# Altium schematic symbol library 13-Analog D 数模模数.SchLib: 573 symbols (part 4 of 6) (continued)
## MAX1162 (continued)
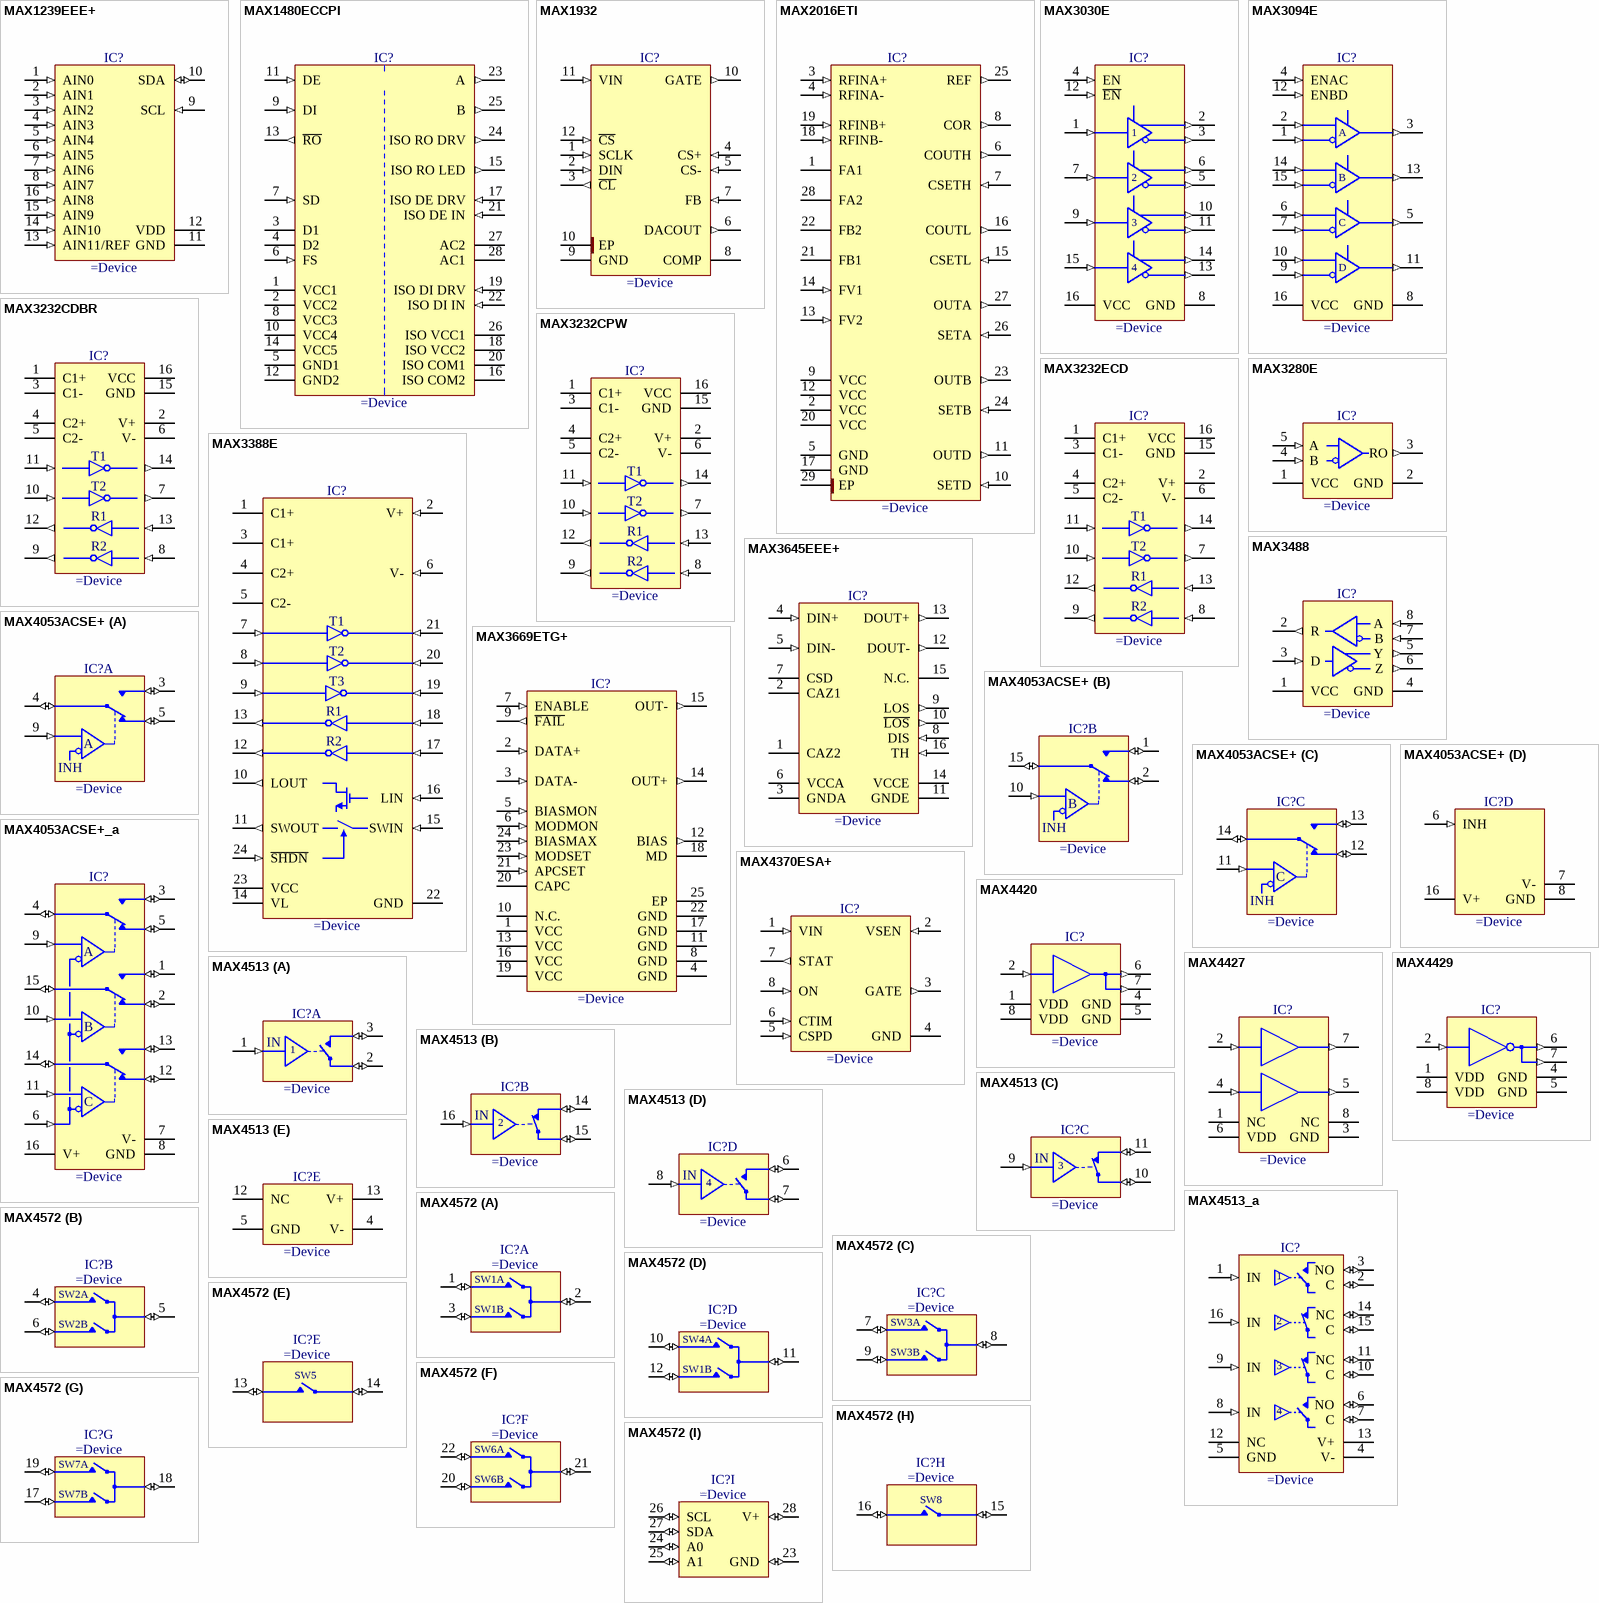
[diagram p26: symbols MAX1239EEE+ to MAX4572]

## MAX1239EEE+
designator IC?
2.7V to 3.6V, Low-Power, 12 Input Channels, 2-Wire Serial, 12-Bit ADC
pins: 1 AIN0 (in), 2 AIN1 (in), 3 AIN2 (in), 4 AIN3 (in), 5 AIN4 (in), 6 AIN5 (in), 7 AIN6 (in), 8 AIN7 (in), 9 SCL (in), 10 SDA (io), 11 GND (power), 12 VDD (power), 13 AIN11/REF (in), 14 AIN10 (in), 15 AIN9 (in), 16 AIN8 (in)

## MAX1480ECCPI
designator IC?
±15kV ESD-Protected, Isolated RS-485/RS-422 Data Interface
pins: 1 VCC1 (power), 2 VCC2 (power), 3 D1, 4 D2, 5 GND1 (power), 6 FS (in), 7 SD (in), 8 VCC3 (power), 9 DI (in), 10 VCC4 (power), 11 DE (in), 12 GND2 (power), 13 ~{RO} (out), 14 VCC5 (power), 15 ISO RO LED (out), 16 ISO COM2 (power), 17 ISO DE DRV (in), 18 ISO VCC2 (power), 19 ISO DI DRV (in), 20 ISO COM1 (power), 21 ISO DE IN (in), 22 ISO DI IN (in), 23 A (out), 24 ISO RO DRV (out), 25 B (out), 26 ISO VCC1 (power), 27 AC2, 28 AC1

## MAX1932
designator IC?
Digitally Controlled, 0.5% Accurate, Safest APD Bias Supply
pins: 1 SCLK (in), 2 DIN (in), 3 ~{CL} (out), 4 CS+ (in), 5 CS- (in), 6 DACOUT (out), 7 FB (in), 8 COMP, 9 GND (power), 10 GATE (out), 10 EP (power), 11 VIN (in), 12 ~{CS} (in)

## MAX2016ETI
designator IC?
LF-to-2.5GHz Dual Logarithmic Detector/Controller for Power, Gain, and VSWR Measurements
pins: 1 FA1, 2 VCC (power), 3 RFINA+ (in), 4 RFINA- (in), 5 GND (power), 6 COUTH (out), 7 CSETH (in), 8 COR (out), 9 VCC (power), 10 SETD (in), 11 OUTD (out), 12 VCC (power), 13 FV2 (in), 14 FV1 (in), 15 CSETL (in), 16 COUTL (out), 17 GND (power), 18 RFINB- (in), 19 RFINB+ (in), 20 VCC (power), 21 FB1, 22 FB2, 23 OUTB (out), 24 SETB (in), 25 REF (out), 26 SETA (in), 27 OUTA (out), 28 FA2, 29 EP (power)

## MAX3030E
designator IC?
±15kV ESD-Protected, 3.3V Quad RS-422 Transmitter
pins: 1 DI1 (in), 2 DO1+ (out), 3 DO1- (out), 4 EN (in), 5 DO2- (out), 6 DO2+ (out), 7 DI2 (in), 8 GND (power), 9 DI3 (in), 10 DO3+ (out), 11 DO3- (out), 12 ~{EN} (in), 13 DO4- (out), 14 DO4+ (out), 15 DI4 (in), 16 VCC (power)

## MAX3094E
designator IC?
±15kV ESD-Protected, 10Mbps, 3V, Low-Power Quad RS-422/RS-485 Receivers
pins: 1 A- (in), 2 A+ (in), 3 YA (out), 4 ENAC (in), 5 YC (out), 6 C+ (in), 7 C- (in), 8 GND (power), 9 D- (in), 10 D+ (in), 11 YD (out), 12 ENBD (in), 13 YB (out), 14 B+ (in), 15 B- (in), 16 VCC (power)
text: A; B; C; D

## MAX3232CDBR
designator IC?
3-V To 5.5-V Multichannel RS-232 Line Driver/Receiver With ±15kV IEC ESD Protection
pins: 1 C1+, 2 V+ (power), 3 C1-, 4 C2+, 5 C2-, 6 V- (power), 7 T2OUT (out), 8 R2IN (in), 9 R2OUT (out), 10 T2IN (in), 11 T1IN (in), 12 R1OUT (out), 13 R1IN (in), 14 T1OUT (out), 15 GND (power), 16 VCC (power)
text: T1; T2; R1; R2

## MAX3232CPW
designator IC?
3-V To 5.5-V Multichannel RS-232 Line Driver/Receiver With ±15kV IEC ESD Protection
pins: 1 C1+, 2 V+ (power), 3 C1-, 4 C2+, 5 C2-, 6 V- (power), 7 T2OUT (out), 8 R2IN (in), 9 R2OUT (out), 10 T2IN (in), 11 T1IN (in), 12 R1OUT (out), 13 R1IN (in), 14 T1OUT (out), 15 GND (power), 16 VCC (power)
text: T1; T2; R1; R2

## MAX3232ECD
designator IC?
3-V To 5.5-V Multichannel RS-232 Line Driver/Receiver With ±15kV IEC ESD Protection
pins: 1 C1+, 2 V+ (power), 3 C1-, 4 C2+, 5 C2-, 6 V- (power), 7 T2OUT (out), 8 R2IN (in), 9 R2OUT (out), 10 T2IN (in), 11 T1IN (in), 12 R1OUT (out), 13 R1IN (in), 14 T1OUT (out), 15 GND (power), 16 VCC (power)
text: T1; T2; R1; R2

## MAX3280E
designator IC?
±15kV ESD-Protected 52Mbps, 3V to 5.5V, RS-485/RS-422 True Fail-Safe Receiver
pins: 1 VCC (power), 2 GND (power), 3 RO (out), 4 B (in), 5 A (in)

## MAX3388E
designator IC?
2.5V, ±15kV ESD-Protected RS-232 Transceivers for PDAs and Cell Phones
footprint TSOP65P640-24AN (TSOP, 24-Leads, Body 7.8x4.4mm, Pitch 0.65mm, IPC Medium Density)
pins: 1 C1+, 2 V+ (in), 3 C1+, 4 C2+, 5 C2-, 6 V- (in), 7 T1IN (in), 8 T2IN (in), 9 T3IN (in), 10 LOUT (out), 11 SWOUT (out), 12 R2OUT (out), 13 R1OUT (out), 14 VL (power), 15 SWIN (in), 16 LIN (in), 17 R2IN (in), 18 R1IN (in), 19 T3OUT (in), 20 T2OUT (in), 21 T1OUT (in), 22 GND (power), 23 VCC (power), 24 ~{SHDN} (in)
text: T1; T2; T3; R1; R2

## MAX3488
designator IC?
3.3V-Powered, ±15kV ESD-Protected, 0.25 Mbps and Slew-Rate-Limited True RS-485/RS-422 Transceiver
pins: 1 VCC (power), 2 R (out), 3 D (in), 4 GND (power), 5 Y (out), 6 Z (out), 7 B (in), 8 A (in)

## MAX3645EEE+
designator IC?
+2.97V to +5.5V, 125Mbps to 200Mbps Limiting Amplifier with Loss-of-Signal Detector
pins: 1 CAZ2, 2 CAZ1, 3 GNDA (power), 4 DIN+ (in), 5 DIN- (in), 6 VCCA (power), 7 CSD, 8 DIS (in), 9 LOS (out), 10 ~{LOS} (out), 11 GNDE (power), 12 DOUT- (out), 13 DOUT+ (out), 14 VCCE (power), 15 N.C., 16 TH (in)

## MAX3669ETG+
designator IC?
+3.3V, 622Mbps SDH/SONET Laser Driver with Current Monitors and APC
pins: 1 VCC (power), 2 DATA+ (in), 3 DATA- (in), 4 GND (power), 5 BIASMON (in), 6 MODMON (in), 7 ENABLE (in), 8 GND (power), 9 ~{FAIL} (out), 10 N.C., 11 GND (power), 12 BIAS (out), 13 VCC (power), 14 OUT+ (out), 15 OUT- (out), 16 VCC, 17 GND (power), 18 MD, 19 VCC (power), 20 CAPC, 21 APCSET (in), 22 GND (power), 23 MODSET (in), 24 BIASMAX (in), 25 EP (power)

## MAX4053ACSE+
designator IC?
Low-Voltage, 3-Channel CMOS Analog Multiplexers/Switches
part A pins: 3 NOA (io), 4 COMA (io), 5 NCA (io), 9 ADDA (in)
part B pins: 1 NOB (io), 2 NCB (io), 10 ADDB (in), 15 COMB (io)
part C pins: 11 ADDC (in), 12 NCC (io), 13 NOC (io), 14 COMC (io)
part D pins: 6 INH (in), 7 V- (power), 8 GND (power), 16 V+ (power)
part A text: A
part B text: B
part C text: C

## MAX4053ACSE+_a
designator IC?
Low-Voltage, 3-Channel CMOS Analog Multiplexers/Switches
pins: 1 NOB (io), 2 NCB (io), 3 NOA (io), 4 COMA (io), 5 NCA (io), 6 INH (in), 7 V- (power), 8 GND (power), 9 ADDA (in), 10 ADDB (in), 11 ADDC (in), 12 NCC (io), 13 NOC (io), 14 COMC (io), 15 COMB (io), 16 V+ (power)
text: A; B; C

## MAX4370ESA+
designator IC?
Current-Regulating Hot-Swap Controller with DualSpeed/BiLevel Fault Protection
pins: 1 VIN (in), 2 VSEN (in), 3 GATE (out), 4 GND (power), 5 CSPD (in), 6 CTIM (in), 7 STAT (out), 8 ON (in)

## MAX4420
designator IC?
Single MOSFET Driver, Non-Inverting Outputs
pins: 1 VDD (power), 2 IN (in), 4 GND (power), 5 GND (power), 6 OUT (out), 7 OUT (out), 8 VDD (power)

## MAX4427
designator IC?
Dual High-Speed 1.5A Noninverting MOSFET Drivers
pins: 1 NC, 2 IN (in), 3 GND (power), 4 IN (in), 5 OUT (out), 6 VDD (power), 7 OUT (out), 8 NC

## MAX4429
designator IC?
Single MOSFET Driver, Inverting Outputs
pins: 1 VDD (power), 2 IN (in), 4 GND (power), 5 GND (power), 6 OUT (out), 7 OUT (out), 8 VDD (power)

## MAX4513
designator IC?
Quad, Rail-to-Rail, Fault-Protected, SPST Analog Switches (2 Normally Open + 2 Normally Close)
part A pins: 1 IN (in), 2 COM (io), 3 NO (io)
part B pins: 14 NC (io), 15 COM (io), 16 IN (in)
part C pins: 9 IN (in), 10 COM (io), 11 NC (io)
part D pins: 6 NO (io), 7 COM (io), 8 IN (in)
part E pins: 4 V- (power), 5 GND (power), 12 NC, 13 V+ (power)

## MAX4513_a
designator IC?
Rail-to-Rail, Fault-Protected, SPST Analog Switches (2 Normally Open + 2 Normally Close)
pins: 1 IN (in), 2 C (io), 3 NO (io), 4 V- (power), 5 GND (power), 6 NO (io), 7 C (io), 8 IN (in), 9 IN (in), 10 C (io), 11 NC (io), 12 NC, 13 V+ (power), 14 NC (io), 15 C (io), 16 IN (in)

## MAX4572
designator IC?
2 x SPST + 6 x SPDT, Serially Controlled, Clickless Audio/Video Switches
part A pins: 1 NO (io), 2 COM (io), 3 NO (io)
part B pins: 4 NO (io), 5 COM (io), 6 NO (io)
part C pins: 7 NO (io), 8 COM (io), 9 NO (io)
part D pins: 10 NO (io), 11 COM (io), 12 NO (io)
part E pins: 13 NO (io), 14 COM (io)
part F pins: 20 NO (io), 21 COM (io), 22 NO (io)
part G pins: 17 NO (io), 18 COM (io), 19 NO (io)
part H pins: 15 COM (io), 16 NO (io)
part I pins: 23 GND (io), 24 A0 (io), 25 A1 (io), 26 SCL (io), 27 SDA (io), 28 V+ (io)
part A text: SW1A; SW1B
part B text: SW2A; SW2B
part C text: SW3A; SW3B
part D text: SW4A; SW1B
part E text: SW5
part F text: SW6A; SW6B
part G text: SW7A; SW7B
part H text: SW8

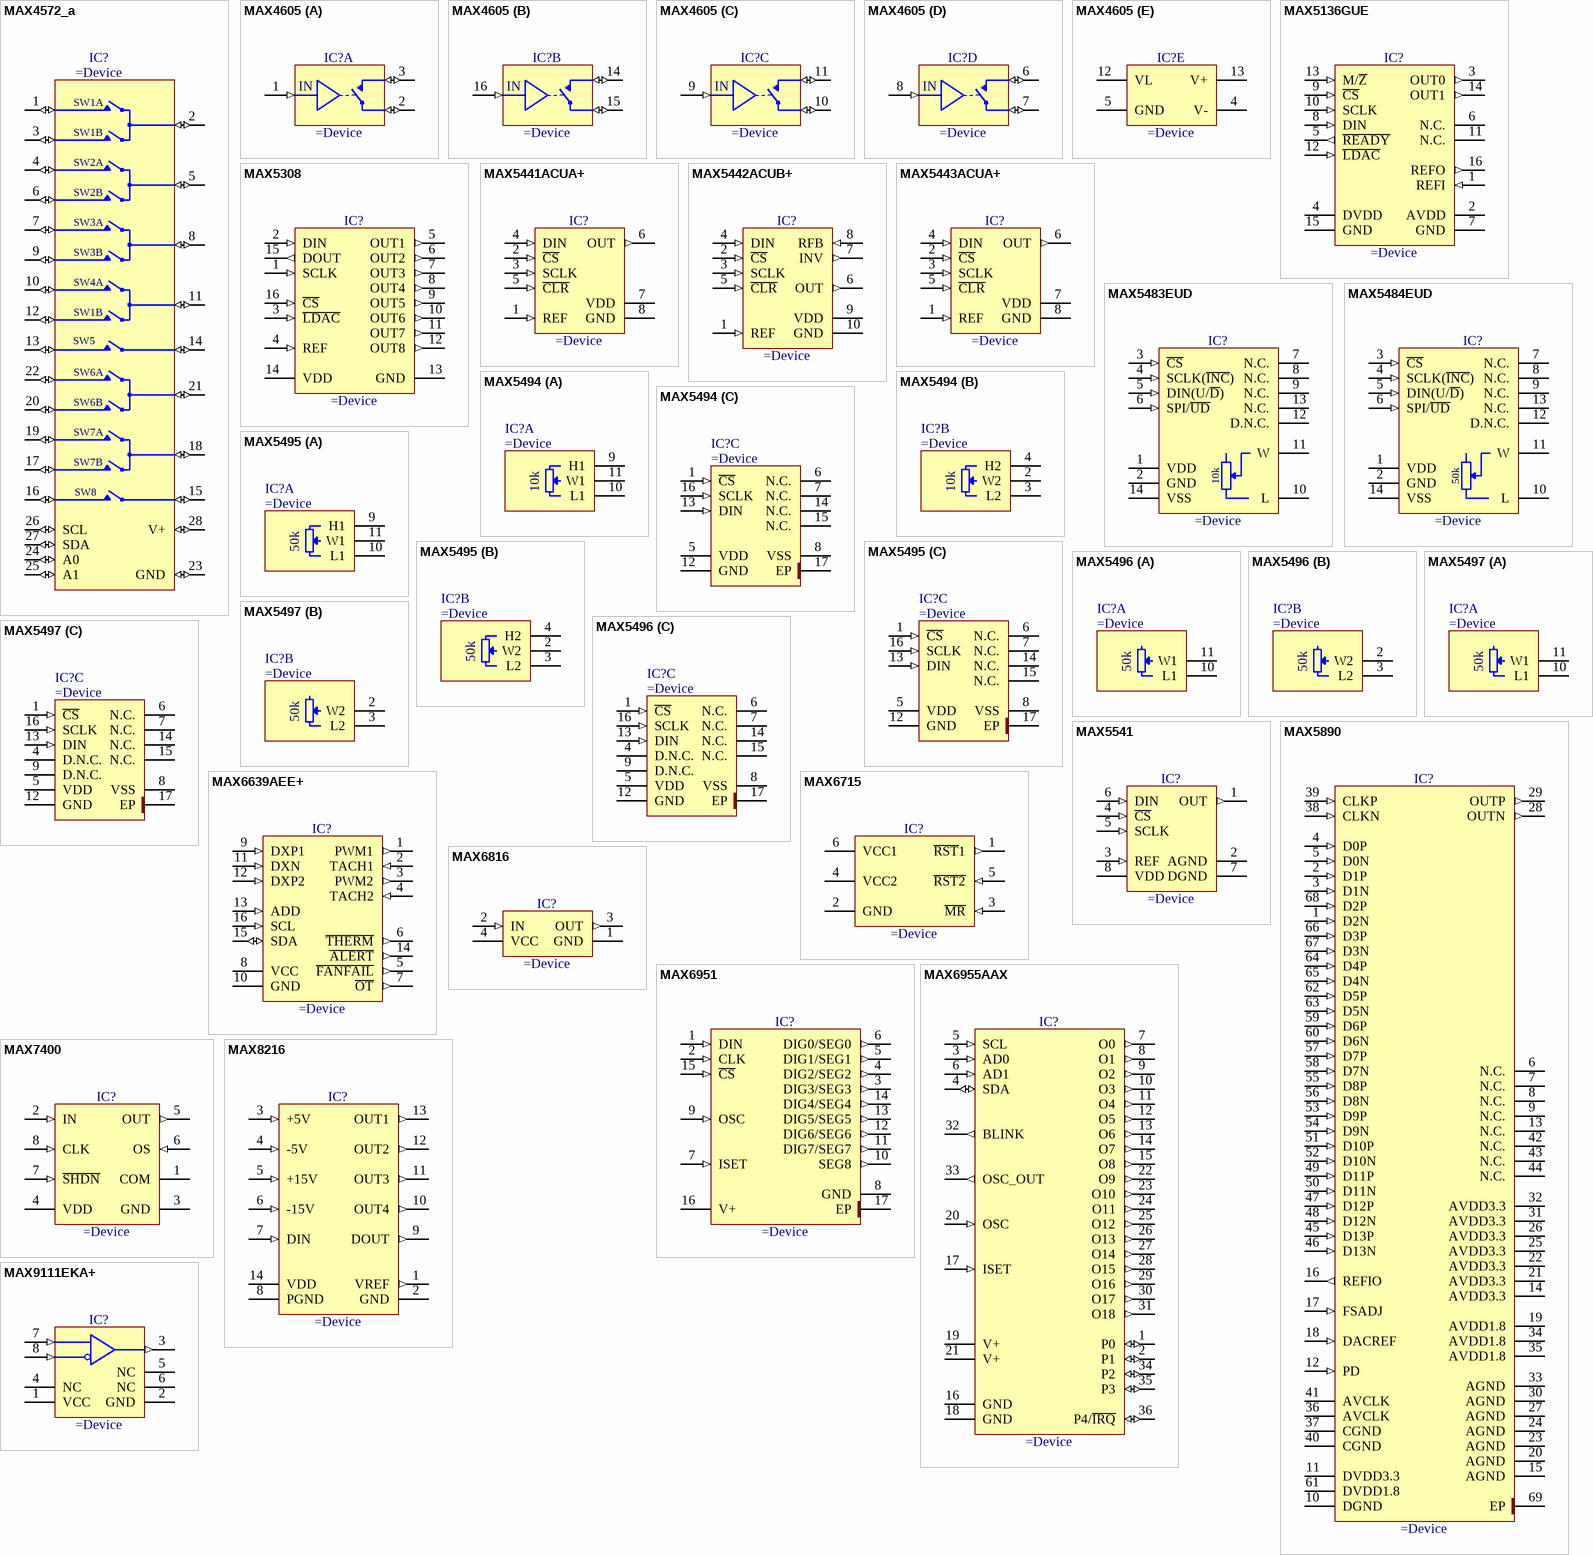
[diagram p27: symbols MAX4572_a to MAX9111EKA+]

## MAX4572_a
designator IC?
2 x SPST + 6 x SPDT, Serially Controlled, Clickless Audio/Video Switches
pins: 1 NO1A (io), 2 COM1 (io), 3 NO1B (io), 4 NO2A (io), 5 COM2 (io), 6 NO2B (io), 7 NO3A (io), 8 COM3 (io), 9 NO3B (io), 10 NO4A (io), 11 COM4 (io), 12 NO4B (io), 13 NO5 (io), 14 VOM5 (io), 15 COM8 (io), 16 NO8 (io), 17 NO7B (io), 18 COM7 (io), 19 NO7A (io), 20 NO6B (io), 21 COM6 (io), 22 NO6A (io), 23 GND (io), 24 A0 (io), 25 A1 (io), 26 SCL (io), 27 SDA (io), 28 V+ (io)
text: SW1A; SW1B; SW2A; SW2B; SW3A; SW3B; SW4A; SW5; SW6A; SW6B; SW7A; SW7B; SW8

## MAX4605
designator IC?
5 Ohms Quad, SPST, CMOS Analog Switches
part A pins: 1 IN (in), 2 COM (io), 3 NO (io)
part B pins: 14 NO (io), 15 COM (io), 16 IN (in)
part C pins: 9 IN (in), 10 COM (io), 11 NO (io)
part D pins: 6 NO (io), 7 COM (io), 8 IN (in)
part E pins: 4 V- (power), 5 GND (power), 12 VL (power), 13 V+ (power)

## MAX5136GUE
designator IC?
Pin-/Software-Compatible, Dual 16-Bit, Voltage-Output DAC
pins: 1 REFI (in), 2 AVDD (power), 3 OUT0 (out), 4 DVDD (power), 5 ~{READY} (out), 6 N.C., 7 GND (power), 8 DIN (in), 9 ~{CS} (in), 10 SCLK (in), 11 N.C., 12 ~{LDAC} (in), 13 M/~{Z} (in), 14 OUT1 (out), 15 GND (power), 16 REFO (out)

## MAX5308
designator IC?
Low-Power, Low-Glitch, Octal 10-Bit Voltage-Output DAC With Serial Interface
pins: 1 SCLK (in), 2 DIN (in), 3 ~{LDAC} (in), 4 REF (in), 5 OUT1 (out), 6 OUT2 (out), 7 OUT3 (out), 8 OUT4 (out), 9 OUT5 (out), 10 OUT6 (out), 11 OUT7 (out), 12 OUT8 (out), 13 GND (power), 14 VDD (power), 15 DOUT (out), 16 ~{CS} (in)

## MAX5441ACUA+
designator IC?
+3V/+5V, Serial-Input, Voltage-Output, 16-Bit ±2LSB DAC
pins: 1 REF (in), 2 ~{CS} (in), 3 SCLK (in), 4 DIN (in), 5 ~{CLR} (in), 6 OUT (out), 7 VDD (power), 8 GND (power)

## MAX5442ACUB+
designator IC?
+5V, Serial-Input, Voltage-Output, 16-Bit ±2LSB DAC
pins: 1 REF (in), 2 ~{CS} (in), 3 SCLK (in), 4 DIN (in), 5 ~{CLR} (in), 6 OUT (out), 7 INV (out), 8 RFB (in), 9 VDD (power), 10 GND (power)

## MAX5443ACUA+
designator IC?
+3V, Serial-Input, Voltage-Output, 16-Bit ±2LSB DAC
pins: 1 REF (in), 2 ~{CS} (in), 3 SCLK (in), 4 DIN (in), 5 ~{CLR} (in), 6 OUT (out), 7 VDD (power), 8 GND (power)

## MAX5483EUD
designator IC?
10-Bit, Nonvolatile Linear-Taper Digital Potentiometer
pins: 1 VDD (power), 2 GND (power), 3 ~{CS} (in), 4 SCLK(~{INC}) (in), 5 DIN(U/~{D}) (in), 6 SPI/~{UD} (in), 7 N.C., 8 N.C., 9 N.C., 10 L, 11 W, 12 D.N.C., 13 N.C., 14 VSS (power)
text: 10k

## MAX5484EUD
designator IC?
10-Bit, Nonvolatile, Linear-Taper Digital Potentiometers
footprint TSOP65P640-24AN (TSOP, 24-Leads, Body 7.8x4.4mm, Pitch 0.65mm, IPC Medium Density)
pins: 1 VDD (power), 2 GND (power), 3 ~{CS} (in), 4 SCLK(~{INC}) (in), 5 DIN(U/~{D}) (in), 6 SPI/~{UD} (in), 7 N.C., 8 N.C., 9 N.C., 10 L, 11 W, 12 D.N.C., 13 N.C., 14 VSS (power)
text: 50k

## MAX5494
designator IC?
10-Bit, Dual, Nonvolatile, 10k Linear-Taper Digital Potentiometer
part A pins: 9 H1, 10 L1, 11 W1
part B pins: 2 W2, 3 L2, 4 H2
part C pins: 1 ~{CS} (in), 5 VDD (power), 6 N.C., 7 N.C., 8 VSS (power), 12 GND (power), 13 DIN (in), 14 N.C., 15 N.C., 16 SCLK (in), 17 EP (power)
part A text: 10k
part B text: 10k

## MAX5495
designator IC?
10-Bit, Dual, Nonvolatile, 50k Linear-Taper Digital Potentiometer
part A pins: 9 H1, 10 L1, 11 W1
part B pins: 2 W2, 3 L2, 4 H2
part C pins: 1 ~{CS} (in), 5 VDD (power), 6 N.C., 7 N.C., 8 VSS (power), 12 GND (power), 13 DIN (in), 14 N.C., 15 N.C., 16 SCLK (in), 17 EP (power)
part A text: 50k
part B text: 50k

## MAX5496
designator IC?
10-Bit, Dual, Nonvolatile, 10k Linear-Taper Digital Potentiometer (Two Variable Resistors)
part A pins: 10 L1, 11 W1
part B pins: 2 W2, 3 L2
part C pins: 1 ~{CS} (in), 4 D.N.C., 5 VDD (power), 6 N.C., 7 N.C., 8 VSS (power), 9 D.N.C., 12 GND (power), 13 DIN (in), 14 N.C., 15 N.C., 16 SCLK (in), 17 EP (power)
part A text: 50k
part B text: 50k

## MAX5497
designator IC?
10-Bit, Dual, Nonvolatile, 50k Linear-Taper Digital Potentiometer (Two Variable Resistors)
part A pins: 10 L1, 11 W1
part B pins: 2 W2, 3 L2
part C pins: 1 ~{CS} (in), 4 D.N.C., 5 VDD (power), 6 N.C., 7 N.C., 8 VSS (power), 9 D.N.C., 12 GND (power), 13 DIN (in), 14 N.C., 15 N.C., 16 SCLK (in), 17 EP (power)
part A text: 50k
part B text: 50k

## MAX5541
designator IC?
Low-Cost, +5V, Serial-Input, Voltage-Output, 16-Bit DAC
pins: 1 OUT (out), 2 AGND (power), 3 REF (in), 4 ~{CS} (in), 5 SCLK (in), 6 DIN (in), 7 DGND (power), 8 VDD (power)

## MAX5890
designator IC?
14-Bit, 600Msps, High-Dynamic-Performance DAC with LVDS Inputs
pins: 1 D2N (in), 2 D1P (in), 3 D1N (in), 4 D0P (in), 5 D0N (in), 6 N.C., 7 N.C., 8 N.C., 9 N.C., 10 DGND (power), 11 DVDD3.3 (power), 12 PD (in), 13 N.C., 14 AVDD3.3 (power), 15 AGND (power), 16 REFIO (out), 17 FSADJ (in), 18 DACREF (in), 19 AVDD1.8 (power), 20 AGND (power), 21 AVDD3.3 (power), 22 AVDD3.3 (power), 23 AGND (power), 24 AGND (power), 25 AVDD3.3 (power), 26 AVDD3.3 (power), 27 AGND (power), 28 OUTN (out), 29 OUTP (out), 30 AGND (power), 31 AVDD3.3 (power), 32 AVDD3.3 (power), 33 AGND (power), 34 AVDD1.8 (power), 35 AVDD1.8 (power), 36 AVCLK (power), 37 CGND (power), 38 CLKN (in), 39 CLKP (in), 40 CGND (power), 41 AVCLK (power), 42 N.C., 43 N.C., 44 N.C., 45 D13P (in), 46 D13N (in), 47 D12P (in), 48 D12N (in), 49 D11P (in), 50 D11N (in), 51 D10P (in), 52 D10N (in), 53 D9P (in), 54 D9N (in), 55 D8P (in), 56 D8N (in), 57 D7P (in), 58 D7N (in), 59 D6P (in), 60 D6N (in), 61 DVDD1.8 (power), 62 D5P (in), 63 D5N (in), 64 D4P (in), 65 D4N (in), 66 D3P (in), 67 D3N (in), 68 D2P (in), 69 EP (power)

## MAX6639AEE+
designator IC?
2-Channel Temperature Monitor with Dual, Automatic, PWM Fan-Speed Controller
pins: 1 PWM1 (out), 2 TACH1 (in), 3 PWM2 (out), 4 TACH2 (in), 5 ~{FANFAIL} (out), 6 ~{THERM} (out), 7 ~{OT} (out), 8 VCC (power), 9 DXP1 (in), 10 GND (power), 11 DXN (in), 12 DXP2 (in), 13 ADD (in), 14 ~{ALERT} (out), 15 SDA (io), 16 SCL (in)

## MAX6715
designator IC?
Dual Ultra-Low-Voltage SOT23 uP Supervisory Circuit
pins: 1 ~{RST}1 (out), 2 GND (power), 3 ~{MR} (in), 4 VCC2 (power), 5 ~{RST2} (in), 6 VCC1 (power)

## MAX6816
designator IC?
±15kV ESD-Protected, Single CMOS Switch Debouncers
pins: 1 GND (power), 2 IN (in), 3 OUT (out), 4 VCC (power)

## MAX6951
designator IC?
Serially Interfaced, +2.7V to +5.5V, 8-Digit 7 segment LED Display Driver
pins: 1 DIN (in), 2 CLK (in), 3 DIG3/SEG3 (out), 4 DIG2/SEG2 (out), 5 DIG1/SEG1 (out), 6 DIG0/SEG0 (out), 7 ISET (in), 8 GND (power), 9 OSC (in), 10 SEG8 (out), 11 DIG7/SEG7 (out), 12 DIG6/SEG6 (out), 13 DIG5/SEG5 (out), 14 DIG4/SEG4 (out), 15 ~{CS} (in), 16 V+ (power), 17 EP (power)

## MAX6955AAX
designator IC?
2-Wire Interfaced, 2.7V to 5.5V LED Display Driver with I/O Expander and Key Scan
pins: 1 P0 (io), 2 P1 (io), 3 AD0 (in), 4 SDA (io), 5 SCL (in), 6 AD1 (in), 7 O0 (out), 8 O1 (out), 9 O2 (out), 10 O3 (out), 11 O4 (out), 12 O5 (out), 13 O6 (out), 14 O7 (out), 15 O8 (out), 16 GND (power), 17 ISET (in), 18 GND (power), 19 V+ (power), 20 OSC (in), 21 V+ (power), 22 O9 (out), 23 O10 (out), 24 O11 (out), 25 O12 (out), 26 O13 (out), 27 O14 (out), 28 O15 (out), 29 O16 (out), 30 O17 (out), 31 O18 (out), 32 BLINK (out), 33 OSC_OUT (out), 34 P2 (io), 35 P3 (io), 36 P4/~{IRQ} (io)

## MAX7400
designator IC?
8th-Order, Lowpass, Elliptic, Switched-Capacitor Filter
pins: 1 COM "Voltage Reference", 2 IN (in) "Non-Inverting Input", 3 GND (power) "Ground", 4 VDD (power) "Ground", 5 OUT (out) "Chip Select Bar", 6 OS (in) "Inverting Input", 7 ~{SHDN} (in) "Serial Data Output", 8 CLK (in) "Serial Clock"

## MAX8216
designator IC?
±5V, ±15V Dedicated Microprocessor Voltage Monitors
pins: 1 VREF (out), 2 GND (power), 3 +5V (in), 4 -5V (in), 5 +15V (in), 6 -15V (in), 7 DIN (in), 8 PGND (power), 9 DOUT (out), 10 OUT4 (out), 11 OUT3 (out), 12 OUT2 (out), 13 OUT1 (out), 14 VDD (power)

## MAX9111EKA+
designator IC?
Single LVDS Line Receiver with Ultra-Low Pulse Skew
pins: 1 VCC (power), 2 GND (power), 3 OUT (out), 4 NC, 5 NC, 6 NC, 7 IN+ (in), 8 IN- (in)

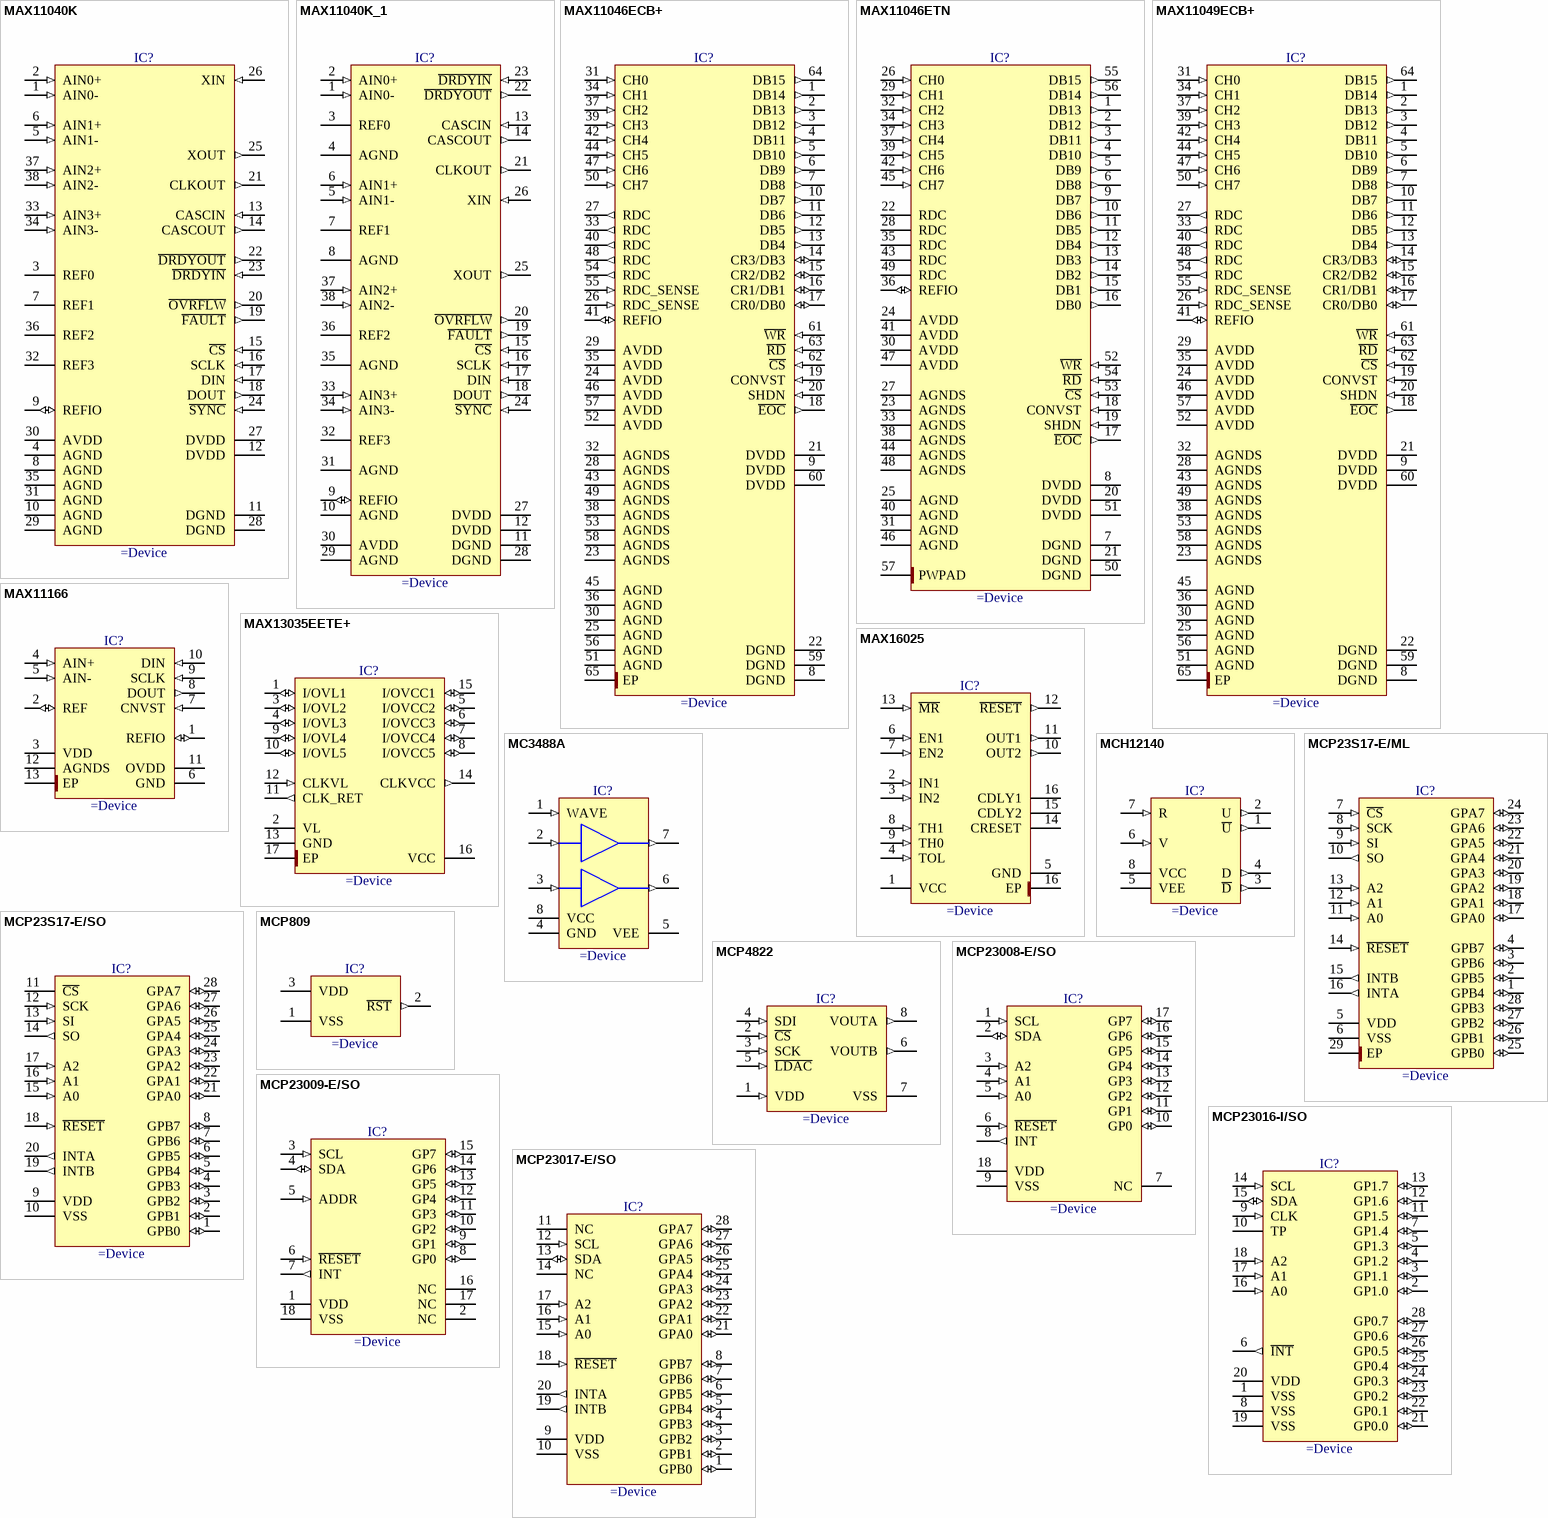
[diagram p28: symbols MAX11040K to MCP23017-E/SO]